# Altium footprint library Controller 1.4.PcbLib: 48 footprints (part 2 of 3)
Each footprint in its own frame and in the unit in brackets; x right, y up, seen from the top. Pads: shape width x height; smd on the part's side, far side on the other; paste and mask are expansions set on the pad; w line width, h text height; cw(c..) or ccw(c..) is an arc to the next point about the centre after c.
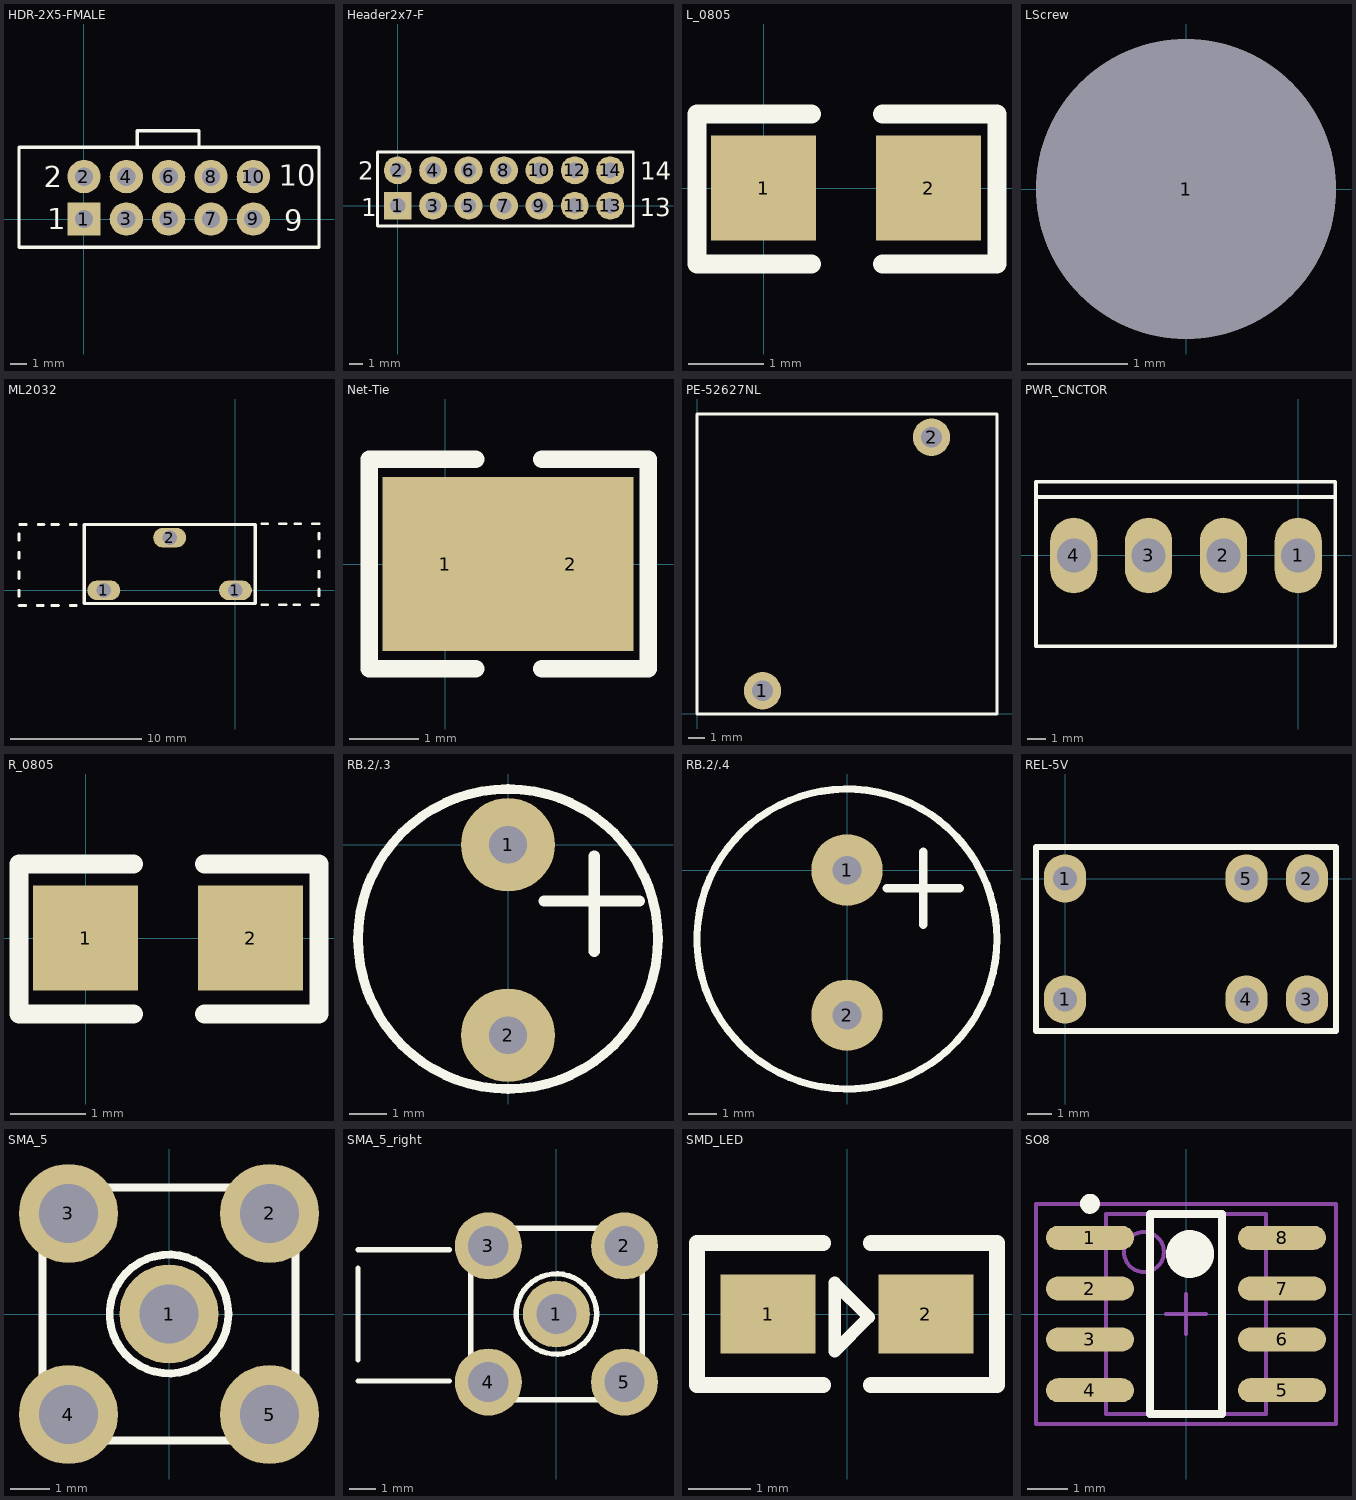
[diagram p1: the footprints below, top view; thin cyan lines are the x and y axes]

## HDR-2X5-FMALE [mm]
pads (10):
  rect 2x2 hole 1.1: 1(0,0)
  round 2 hole 1.1: 2(0,2.54) 3(2.54,0) 4(2.54,2.54) 5(5.08,0) 6(5.08,2.54) 7(7.62,0) 8(7.62,2.54) 9(10.16,0) 10(10.16,2.54)
Top Overlay:
  lines w0.2: 3.2,4.3 3.2,5.3 6.9,5.3 6.9,4.3 ; 14.08,-1.7 -3.9,-1.7 -3.9,4.3 14.08,4.3 ; 14.1,-1.7 14.1,4.3
  text "10" at 11.7,2 h1.27
  text "9" at 12,-0.7 h1.27
  text "1" at -2.2,-0.6 h1.27
  text "2" at -2.4,1.9 h1.27
3D body: height 8.5, standoff -2.65, extent -1.524,-1.207 11.684,3.746

## Header2x7-F [mm] "AF-lib"
pads (14):
  rect 2x2 hole 1.1: 1(0,0)
  round 2 hole 1.1: 2(0,2.54) 3(2.54,0) 4(2.54,2.54) 5(5.08,0) 6(5.08,2.54) 7(7.62,0) 8(7.62,2.54) 9(10.16,0) 10(10.16,2.54) 11(12.7,0) 12(12.7,2.54) 13(15.24,0) 14(15.24,2.54)
Top Overlay:
  lines w0.2: -1.45,-1.45 -1.45,3.85 16.9,3.85 16.9,-1.45 -1.45,-1.45
  text "14" at 17.4,1.85 h1.27
  text "13" at 17.35,-0.75 h1.27
  text "1" at -2.6,-0.75 h1.27
  text "2" at -2.85,1.85 h1.27
3D body: height 8.5, standoff -3.2, extent 6.29,-1.3 16.7,3.7
3D body: height 8.5, standoff -3.2, extent -1.31,-1.3 9.1,3.7

## L_0805 [mm]
pads (2):
  rect 1.4x1.4 smd: 1(0,0) 2(2.2,0)
Top Overlay:
  lines w0.254: 0.635,-1.011 -0.889,-1.011 -0.889,-0.789 -0.889,0.989 0.635,0.989 ; 1.587,-1.011 3.111,-1.011 3.111,-0.789 3.111,0.989 1.587,0.989
3D body: height 0.95, standoff 0, extent 0.1,-0.6 2.1,0.6

## LScrew [mm]
pads (1):
  round 3 hole 3: 1(0,0)

## ML2032 [mm]
pads (3):
  oval 2.5x1.5 hole 1.1: 1(-10,0) 1(0,0) 2(-5,4)
Top Overlay:
  lines w0.2: -16.45,-1.15 -15.95,-1.15 ; -16.45,-0.45 -16.45,0 ; -16.45,0.9 -16.45,1.4 ; -16.45,2.45 -16.45,2.9 ; -16.45,3.8 -16.45,4.3 ; -16.4,5 -15.9,5 ; -15.05,-1.15 -14.6,-1.15 ; -15,5 -14.55,5 ; -13.95,-1.15 -13.45,-1.15 ; -13.95,5 -13.45,5 ; -12.55,-1.15 -12.1,-1.15 ; -12.55,5 -12.1,5 ; 2,-1.1 2.45,-1.1 ; 2,5.05 2.45,5.05 ; 3.35,-1.1 3.85,-1.1 ; 3.35,5.05 3.85,5.05 ; 4.45,-1.1 4.9,-1.1 ; 4.5,5.05 4.95,5.05 ; 5.8,-1.1 6.3,-1.1 ; 5.85,5.05 6.35,5.05 ; 6.35,-0.4 6.35,0.1 ; 6.35,1 6.35,1.45 ; 6.35,2.5 6.35,3 ; 6.35,3.9 6.35,4.35
  lines w0.254: -11.5,-1 1.5,-1 1.5,5 -11.5,5 -11.5,-1
3D body: height 23.5, standoff -4, extent -15.08,0.127 4.92,3.927

## Net-Tie [mm]
pads (2):
  rect 1.8x2.5 smd: 1(0,0) 2(1.8,0)
Top Layer:
  rectangle: -0.8,-1.2 2.6,1.2
  lines w1.4: 0,0 1.8,0
Top Overlay:
  lines w0.254: 0.435,-1.5 -1.089,-1.5 -1.089,-0.789 -1.089,1.5 0.435,1.5 ; 1.387,-1.5 2.911,-1.5 2.911,-0.789 2.911,1.5 1.387,1.5
3D body: height 0.78, standoff 0, extent -0.1,-0.635 1.9,0.615

## PE-52627NL [mm]
pads (2):
  round 2.25 hole 1.25: 1(3.937,1.397) 2(14.097,16.637)
Top Overlay:
  lines w0.2: 0,18.03 0,0 18.03,0 ; 0.004,18.034 18.034,18.034 ; 18.034,0 18.034,18.03
3D body: height 11.68, standoff 0, extent 0,0 18.1,18.1

## PWR_CNCTOR [mm]
pads (4):
  oval 2.5x4 hole 1.8: 1(0,0) 2(-3.96,0) 3(-7.92,0) 4(-11.88,0)
Top Overlay:
  lines w0.2: -13.88,3.1 1.96,3.1 ; -13.88,-4.8 1.96,-4.8 1.96,3.9 -13.88,3.9 -13.88,-4.8
3D body: height 14.83, standoff -3.46, extent -13.729,-5.208 1.969,4.8

## R_0805 [mm]
pads (2):
  rect 1.4x1.4 smd: 1(0,0) 2(2.2,0)
Top Overlay:
  lines w0.254: 0.635,-1.011 -0.889,-1.011 -0.889,-0.789 -0.889,0.989 0.635,0.989 ; 1.587,-1.011 3.111,-1.011 3.111,-0.789 3.111,0.989 1.587,0.989
3D body: height 0.78, standoff 0, extent 0.1,-0.635 2.1,0.615

## RB.2/.3 [mm]
pads (2):
  round 2.5 hole 1: 1(0,0) 2(0,-5.08)
Top Overlay:
  circle w0.254: c0,-2.513 r4
  lines w0.305: 0.96,-1.5 3.5,-1.5 ; 2.3,-2.84 2.3,-0.3

## RB.2/.4 [mm]
pads (2):
  round 2.5 hole 1: 1(0,0) 2(0,-5.08)
Top Overlay:
  circle w0.254: c0,-2.413 r5.25
  lines w0.305: 1.397,-0.635 3.937,-0.635 ; 2.667,-1.905 2.667,0.635
3D body: height 20.01, standoff -2.7, extent -5,-7.493 5,2.474

## REL-5V [mm]
pads (6):
  oval 1.75x2 hole 1: 1(0,0) 1(0,-5) 2(10,0) 3(10,-5) 4(7.5,-5) 5(7.5,0)
Top Overlay:
  lines w0.254: -1.2,-6.3 11.2,-6.3 11.2,1.3 -1.2,1.3 -1.2,-6.3
3D body: height 10, standoff -3.5, extent -1.297,-6.23 11.203,1.27

## SMA_5 [mm]
height 1.2
pads (5):
  round 2.5 hole 1.5: 1(0,0) 2(2.54,2.54) 3(-2.54,2.54) 4(-2.54,-2.54) 5(2.54,-2.54)
Top Overlay:
  circle w0.2: c0,0 r1.5
  lines w0.2: -3.2,-3.2 3.2,-3.2 3.2,3.2 -3.2,3.2 -3.2,-3.2

## SMA_5_right [mm]
height 1.2
pads (5):
  round 2.5 hole 1.5: 1(0,0) 2(2.54,2.54) 3(-2.54,2.54) 4(-2.54,-2.54) 5(2.54,-2.54)
Top Overlay:
  circle w0.2: c0,0 r1.5
  lines w0.2: -7.4,-2.5 -4,-2.5 ; -7.4,-1.7 -7.4,1.7 ; -7.4,2.4 -4,2.4 ; -3.2,-3.2 -3.2,3.2 3.2,3.2 3.2,-3.2 -3.2,-3.2
3D body: height 4.24, standoff -9.86, extent -11.6,-3.5 3.5,3.5

## SMD_LED [mil]
pads (2):
  rect 60x50 smd: 1(-50,0) 2(50,0)
Top Overlay:
  lines w7.87: -7.87,-23.62 -7.87,-12.8 -7.87,8.86 -7.87,19.68 13.78,-1.97 -7.87,-23.62
  lines w10: -15,-45 -95,-45 -95,45 -15,45 ; 15,-45 95,-45 95,45 15,45

## SO8 [mm] "HFA1135IBZ"
height 1.75
pads (8):
  oval 2.2x0.6 smd: 1(-2.4,1.905) 2(-2.4,0.635) 3(-2.4,-0.635) 4(-2.4,-1.905) 5(2.4,-1.905) 6(2.4,-0.635) 7(2.4,0.635) 8(2.4,1.905)
Top Overlay:
  circle w0.6: c0.1,1.5 r0.3
  circle w0.25: c-2.4,2.755 r0.125
  lines w0.2: -0.9,-2.5 0.9,-2.5 0.9,2.5 -0.9,2.5 -0.9,-2.5
Mechanical 13:
  circle w0.1: c-1.05,1.55 r0.5
  lines w0.1: -2,-2.5 2,-2.5 2,2.5 -2,2.5 -2,-2.5
Mechanical 15:
  lines w0.1: -0.5,0 0.5,0 ; 0,-0.5 0,0.5 ; -3.75,-2.75 3.75,-2.75 3.75,2.75 -3.75,2.75 -3.75,-2.75
3D body: height 1.73, standoff -0.04, extent -3.068,-2.45 3.068,2.44